# Altium footprint library lib_eps.PcbLib: 113 footprints (part 4 of 8)
Each footprint in its own frame and in the unit in brackets; x right, y up, seen from the top. Pads: shape width x height; smd on the part's side, far side on the other; paste and mask are expansions set on the pad; w line width, h text height; cw(c..) or ccw(c..) is an arc to the next point about the centre after c.
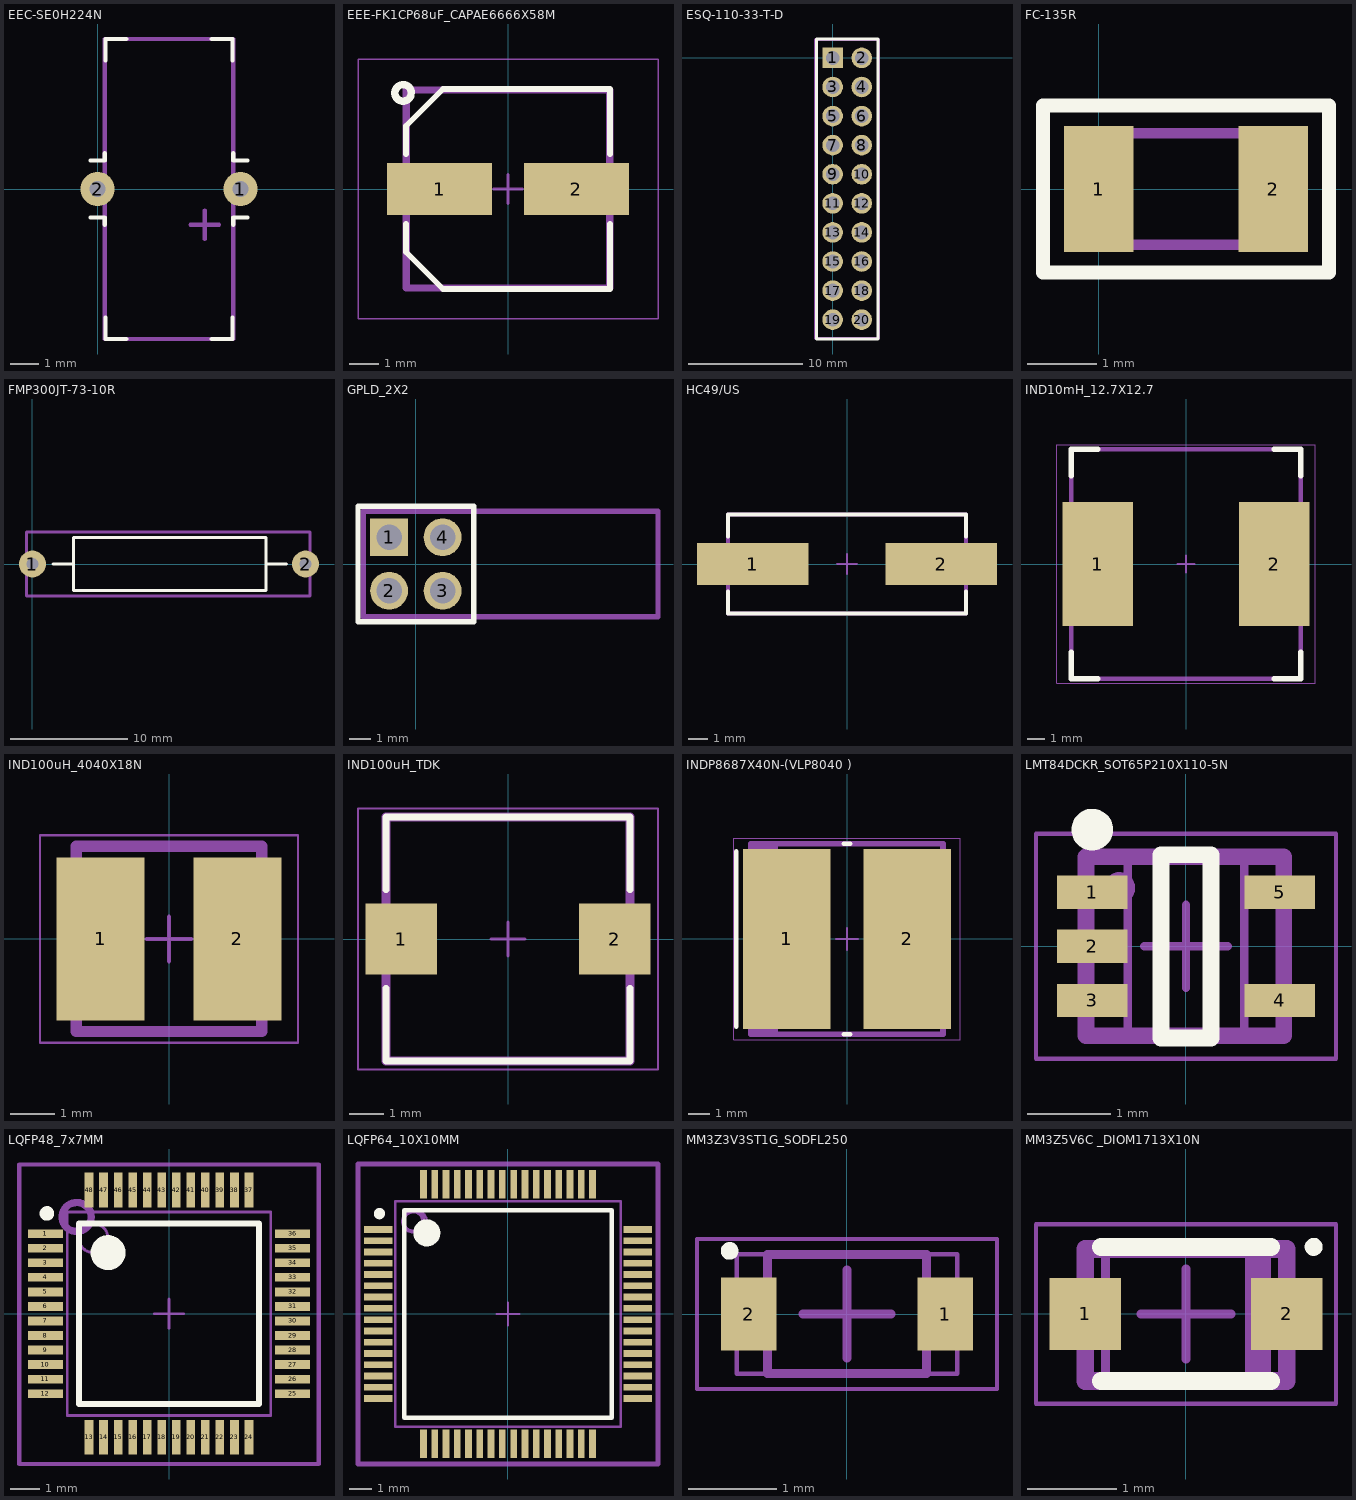
[diagram p3: the footprints below, top view; thin cyan lines are the x and y axes]

## EEC-SE0H224N [mm] "CAP .22F 5.5V T/H"
pads (2):
  round 1.2 hole 0.55: 1(5,0) 2(0,0)
Top Overlay:
  lines w0.15: -0.25,-1 0.25,-1 0.25,-1.25 ; -0.25,1 0.25,1 0.25,1.25 ; 0.275,-4.5 0.275,-5.25 1,-5.25 ; 0.275,4.5 0.275,5.25 1,5.25 ; 4,-5.25 4.725,-5.25 4.725,-4.5 ; 4,5.25 4.725,5.25 4.725,4.5 ; 4.75,-1.25 4.75,-1 5.25,-1 ; 4.75,1.25 4.75,1 5.25,1
Mechanical 29:
  lines w0.15: 3.75,-1.75 3.75,-0.75 3.75,-1.25 ; 3.75,-1.25 4.25,-1.25 3.25,-1.25 3.75,-1.25 ; 0,-0.25 0,0.25 0.25,0.25 0.25,5.25 4.75,5.25 4.75,0.25 5,0.25 5,-0.25 4.75,-0.25 4.75,-5.25 0.25,-5.25 0.25,-0.25 0,-0.25
  text "'.Designator'" at 2.5,-5.25 h1

## EEE-FK1CP68uF_CAPAE6666X58M [mm] "Aluminum Electrolytic Capacitor, Body 7,00x6,60x5,80mm, IPC Low Density"
height 5.8
pads (2):
  rect 3.6x1.8 smd: 1(-2.35,0) 2(2.35,0)
Top Overlay:
  lines w0.2: -3.5,-1.2 -3.5,-2.165 -2.235,-3.43 3.5,-3.43 3.5,-1.2 ; -3.5,1.2 -3.5,2.165 -2.235,3.43 3.5,3.43 3.5,1.2
  lines w0.254: -3.332,3.211 cw(c-3.6,3.3) -3.317,3.3
Mechanical 13:
  lines w0.1: -3.5,-2.165 -3.5,2.165 -2.235,3.43 3.5,3.43 3.5,-3.43 -2.235,-3.43 -3.5,-2.165
Mechanical 15:
  lines w0.05: -5.15,-4.45 5.15,-4.45 5.15,4.45 -5.15,4.45 -5.15,-4.45
  lines w0.1: -0.5,0 0.5,0 ; 0,-0.5 0,0.5
Mechanical 29:
  lines w0.254: -3.5,-3.4 -3.5,-1 -3.5,3.4 3.5,3.4 3.5,-3.4 -3.5,-3.4
  text "'.Designator'" at -4.1,-0.9 h1.52
3D body "CPEEE-FK1CP68uF_CAPAE6666X58M.step": height 5.8, standoff -0.4, extent -3.5,-3.43 3.5,3.43

## ESQ-110-33-T-D [mm] "CONN SOCKET 20POS 0.1 TIN PCB"
height 0.231
pads (20):
  rect 1.8x1.8 hole 1.2: 1(0,0)
  round 1.8 hole 1.2: 2(2.54,0) 3(0,-2.54) 4(2.54,-2.54) 5(0,-5.08) 6(2.54,-5.08) 7(0,-7.62) 8(2.54,-7.62) 9(0,-10.16) 10(2.54,-10.16) 11(0,-12.7) 12(2.54,-12.7) 13(0,-15.24) 14(2.54,-15.24) 15(0,-17.78) 16(2.54,-17.78) 17(0,-20.32) 18(2.54,-20.32) 19(0,-22.86) 20(2.54,-22.86)
Top Overlay:
  lines w0.254: -1.425,-24.55 -1.425,1.65 3.95,1.65 3.95,-24.55 -1.425,-24.55
Mechanical 29:
  lines w0.254: -1.5,-24.5 -1.25,-24.5 4,-24.5 4,1.6 -1.5,1.6 -1.5,-24.5
  text "'.Designator'" at 2.1,-19.8 h1.52
3D body "ESQ-110-33-T-D.stp": height 16.41, standoff -2.01, extent -1.29,-24.408 3.79,1.5

## FC-135R [mm] "FC-135 32.7680KA-A5.FC-135 32.7680KA-A5"
pads (2):
  rect 1x1.8 smd: 1(0,0) 2(2.5,0)
Top Overlay:
  lines w0.2: -0.8,-1.2 3.3,-1.2 3.3,1.2 -0.8,1.2 -0.8,-1.2
Mechanical 29:
  lines w0.15: -0.3,-0.8 -0.3,0.8 2.8,0.8 2.8,-0.8 -0.3,-0.8
  text "'.Designator'" at 0.3,-0.5 h1
3D body "EPSON_SG-3030CM.STEP": height 0.9, standoff 0, extent -0.351,-0.751 2.851,0.751

## FMP300JT-73-10R [mm] "RES 10 OHM 3W 5% AXIAL"
pads (2):
  round 2.3 hole 1: 1(0,0) 2(23.375,0)
Top Overlay:
  lines w0.254: 1.75,0 3.5,0 ; 21.75,0 20,0 ; 3.5,0 3.5,2.25 20,2.25 20,0 ; 3.5,0 3.5,-2.25 20,-2.25 20,0
Mechanical 29:
  lines w0.254: -0.5,-2.75 -0.5,1.25 -0.5,2.75 23.75,2.75 23.75,-2.75 -0.5,-2.75
  text "'.Designator'" at 6.5,-0.75 h1.52
3D body "YAG_FMP300.step": height 5.51, standoff -0.67, extent -0.432,-2.756 23.8,2.756

## GPLD_2X2 [mm] "CONN SOCKET 20POS 0.1 TIN PCB"
height 0.231
pads (4):
  rect 1.8x1.8 hole 1.2: 1(-1.27,1.27)
  round 1.8 hole 1.2: 2(-1.27,-1.27) 3(1.27,-1.27) 4(1.27,1.27)
Top Overlay:
  lines w0.254: -2.75,-2.75 -2.75,2.5 -2.75,2.75 2.75,2.75 2.75,-2.75 -2.75,-2.75
Mechanical 29:
  lines w0.254: -2.5,-2.5 -2.5,2.5 2.5,2.5 11.5,2.5 11.5,-2.5 2.5,-2.5 -2.5,-2.5
  text "'.Designator'" at -2,-0.1 h0.6
3D body "DS1022-2x2RF11.stp": height 5, standoff -3, extent -1.59,-2.54 11.45,2.54

## HC49/US [mm] "HC/49US (AT49) SMD LOW PROFILE CRYSTAL"
pads (2):
  rect 5.6x2.1 smd: 1(-4.75,0) 2(4.75,0)
Top Overlay:
  lines w0.2: -6,-1.372 -6,-2.5 6,-2.5 6,-1.372 ; -6,1.372 -6,2.5 6,2.5 6,1.372
Mechanical 15:
  lines w0.1: -0.5,0 0.5,0 ; 0,-0.5 0,0.5
Mechanical 29:
  lines w0.2: -6,0.457 -6.68,0.457 -6.68,-0.559 -5.994,-0.559 ; 5.994,0.483 6.68,0.483 6.68,-0.533 6,-0.533 ; -6,-2.5 6,-2.5 6,2.5 -6,2.5 -6,-2.5
  text ".Designator" at -3.632,-0.305 h0.8
3D body "ABLS.STEP": height 4.21, standoff 0.05, extent -6.35,-2.388 6.35,2.311

## IND10mH_12.7X12.7 [mm] "Precision Wire Wound Inductor, 2-Leads, Body 12,70x12,70mm, IPC Medium Density"
height 8.5
pads (2):
  rect 4x7 smd: 1(-5,0) 2(5,0)
Top Overlay:
  lines w0.3: -6.5,-5 -6.5,-6.5 -5,-6.5 ; -6.5,5 -6.5,6.5 -5,6.5 ; 5,-6.5 6.5,-6.5 6.5,-5 ; 5,6.5 6.5,6.5 6.5,5
Mechanical 13:
  lines w0.1: -6.5,-6.5 6.5,-6.5 6.5,6.5 -6.5,6.5 -6.5,-6.5
Mechanical 15:
  lines w0.05: -7.325,-6.75 7.325,-6.75 7.325,6.75 -7.325,6.75 -7.325,-6.75
  lines w0.1: -0.5,0 0.5,0 ; 0,-0.5 0,0.5
Mechanical 29:
  lines w0.254: -6.5,-6.5 6.5,-6.5 6.5,6.5 -6.5,6.5 -6.5,3.75 -6.5,-6.5
  text "'.Designator'" at -4.2,-1 h1.52
3D body "IND10mH_12.7X12.7.step": height 8.6, standoff 0, extent -6.45,-6.35 6.45,6.35

## IND100uH_4040X18N [mm] "Precision Wire Wound Inductor, 2-Leads, Body 4,00x4,00mm, IPC Medium Density"
height 1.8
pads (2):
  rect 2x3.7 smd: 1(-1.55,0) 2(1.55,0)
Mechanical 13:
  lines w0.1: -2.1,-2.1 -2.1,2.1 2.1,2.1 2.1,-2.1 -2.1,-2.1
Mechanical 15:
  lines w0.05: -2.925,-2.35 -2.925,2.35 2.925,2.35 2.925,-2.35 -2.925,-2.35
  lines w0.1: -0.5,0 0.5,0 ; 0,-0.5 0,0.5
Mechanical 29:
  lines w0.254: -2.1,-2.1 2.1,-2.1 2.1,2.1 -2.1,2.1 -2.1,-2.1
  text "'.Designator'" at -1.6,-0.5 h1
3D body "IND100uH_4040X18N.step": height 1.9, standoff 0, extent -2.1,-2 2.1,2

## IND100uH_TDK [mm] "Precision Wire Wound Inductor, 2-Leads, Body 7,00x7,00mm, IPC Medium Density"
height 4.5
pads (2):
  rect 2.1x2.1 smd: 1(-3.15,0) 2(3.15,0)
Top Overlay:
  lines w0.2: -3.6,-1.45 -3.6,-3.6 3.6,-3.6 3.6,-1.45 ; -3.6,1.45 -3.6,3.6 3.6,3.6 3.6,1.45
Mechanical 13:
  lines w0.1: -3.6,-3.6 3.6,-3.6 3.6,3.6 -3.6,3.6 -3.6,-3.6
Mechanical 15:
  lines w0.05: -4.425,-3.85 4.425,-3.85 4.425,3.85 -4.425,3.85 -4.425,-3.85
  lines w0.1: -0.5,0 0.5,0 ; 0,-0.5 0,0.5
Mechanical 29:
  lines w0.254: -3.6,-3.6 -3.6,1.2 -3.6,3.6 3.6,3.6 3.6,-3.6 -3.6,-3.6
  text "'.Designator'" at -3.9,-0.5 h1.52
3D body "IND100uH_TDK.step": height 4.6, standoff 0, extent -3.6,-3.5 3.6,3.5

## INDP8687X40N-(VLP8040 ) [mm] "Precision Wire Wound Inductor, 2-Leads, Body 8,60x8,70mm, IPC Medium Density"
height 4
pads (2):
  rect 4x8.2 smd paste-5: 1(-2.75,0) 2(2.75,0)
Top Overlay:
  lines w0.2: -5.05,-4 -5.05,4 ; -0.15,-4.35 0.15,-4.35 ; -0.15,4.35 0.15,4.35
Top Paste:
  region: 3.15,-2.5 4.65,-2.5 4.65,-3.8 3.15,-3.8
  region: 0.85,-2.5 2.35,-2.5 2.35,-3.8 0.85,-3.8
  region: 3.15,-0.4 4.65,-0.4 4.65,-1.7 3.15,-1.7
  region: 0.85,-0.4 2.35,-0.4 2.35,-1.7 0.85,-1.7
  region: 3.15,1.7 4.65,1.7 4.65,0.4 3.15,0.4
  region: 0.85,1.7 2.35,1.7 2.35,0.4 0.85,0.4
  region: 3.15,3.8 4.65,3.8 4.65,2.5 3.15,2.5
  region: 0.85,3.8 2.35,3.8 2.35,2.5 0.85,2.5
  region: -2.35,-2.5 -0.85,-2.5 -0.85,-3.8 -2.35,-3.8
  region: -4.65,-2.5 -3.15,-2.5 -3.15,-3.8 -4.65,-3.8
  region: -2.35,-0.4 -0.85,-0.4 -0.85,-1.7 -2.35,-1.7
  region: -4.65,-0.4 -3.15,-0.4 -3.15,-1.7 -4.65,-1.7
  region: -2.35,1.7 -0.85,1.7 -0.85,0.4 -2.35,0.4
  region: -4.65,1.7 -3.15,1.7 -3.15,0.4 -4.65,0.4
  region: -2.35,3.8 -0.85,3.8 -0.85,2.5 -2.35,2.5
  region: -4.65,3.8 -3.15,3.8 -3.15,2.5 -4.65,2.5
Mechanical 13:
  rectangle: -4.3,-4.35 -3.143,4.35
  lines w0.1: -4.3,-4.35 -4.3,4.35 4.3,4.35 4.3,-4.35 -4.3,-4.35
Mechanical 15:
  lines w0.05: -5.175,-4.6 -5.175,4.6 5.175,4.6 5.175,-4.6 -5.175,-4.6
  lines w0.1: -0.5,0 0.5,0 ; 0,-0.5 0,0.5
Mechanical 29:
  lines w0.254: -4.4,-4.35 4.4,-4.35 4.4,4.35 -4.4,4.35 -4.4,-4.35
  text "'.Designator'" at -2.6,-0.5 h2
3D body "INDP8687X40N-(VLP8040 ).step": height 4.1, standoff 0, extent -4.4,-4.35 4.4,4.35

## LMT84DCKR_SOT65P210X110-5N [mm] "SOT23, 5-Leads, Body 2,00x2,10mm, Pitch 0,65mm, IPC Medium Density"
height 1.1
pads (5):
  rect 0.85x0.4 smd mask+0.051: 1(-1.125,0.65) 2(-1.125,0) 3(-1.125,-0.65) 4(1.125,-0.65) 5(1.125,0.65)
Top Overlay:
  circle w0.25: c-1.125,1.4 r0.125
  lines w0.2: -0.3,-1.1 0.3,-1.1 0.3,1.1 -0.3,1.1 -0.3,-1.1
Mechanical 13:
  lines w0.1: -0.7,-1.075 -0.7,1.075 0.7,1.075 0.7,-1.075 -0.7,-1.075
Mechanical 15:
  lines w0.05: -1.8,-1.35 -1.8,1.35 1.8,1.35 1.8,-1.35 -1.8,-1.35
  lines w0.1: -0.5,0 0.5,0 ; 0,-0.5 0,0.5
Mechanical 29:
  circle w0.18: c-0.8,0.7 r0.1
  lines w0.2: -1.2,-1.075 1.175,-1.075 1.175,1.075 -1.2,1.075 -1.2,0.537 -1.2,-0.537 -1.2,-1.075
  text "'.Designator'" at -0.9,-0.2 h0.6
3D body "LMT84DCKR_SOT65P210X110-5N.step": height 1.1, standoff 0, extent -1.2,-1.075 1.2,1.075

## LQFP48_7x7MM [mm] "LQFP, 48-Leads, Body 7,00x7,00mm, Pitch 0,50mm"
height 1.6
pads (48):
  rect 1.2x0.3 smd mask+0.051: 1(-4.25,2.75) 2(-4.25,2.25) 3(-4.25,1.75) 4(-4.25,1.25) 5(-4.25,0.75) 6(-4.25,0.25) 7(-4.25,-0.25) 8(-4.25,-0.75) 9(-4.25,-1.25) 10(-4.25,-1.75) 11(-4.25,-2.25) 12(-4.25,-2.75) 25(4.25,-2.75) 26(4.25,-2.25) 27(4.25,-1.75) 28(4.25,-1.25) 29(4.25,-0.75) 30(4.25,-0.25) 31(4.25,0.25) 32(4.25,0.75) 33(4.25,1.25) 34(4.25,1.75) 35(4.25,2.25) 36(4.25,2.75)
  rect 0.3x1.2 smd mask+0.051: 13(-2.75,-4.25) 14(-2.25,-4.25) 15(-1.75,-4.25) 16(-1.25,-4.25) 17(-0.75,-4.25) 18(-0.25,-4.25) 19(0.25,-4.25) 20(0.75,-4.25) 21(1.25,-4.25) 22(1.75,-4.25) 23(2.25,-4.25) 24(2.75,-4.25) 37(2.75,4.25) 38(2.25,4.25) 39(1.75,4.25) 40(1.25,4.25) 41(0.75,4.25) 42(0.25,4.25) 43(-0.25,4.25) 44(-0.75,4.25) 45(-1.25,4.25) 46(-1.75,4.25) 47(-2.25,4.25) 48(-2.75,4.25)
Top Overlay:
  circle w0.6: c-2.1,2.1 r0.3
  circle w0.25: c-4.2,3.45 r0.125
  lines w0.2: -3.1,-3.1 3.1,-3.1 3.1,3.1 -3.1,3.1 -3.1,-3.1
Mechanical 13:
  circle w0.1: c-2.6,2.6 r0.5
  lines w0.1: -3.5,-3.5 3.5,-3.5 3.5,3.5 -3.5,3.5 -3.5,-3.5
Mechanical 15:
  lines w0.05: -5.15,-5.15 5.15,-5.15 5.15,5.15 -5.15,5.15 -5.15,-5.15
  lines w0.1: -0.5,0 0.5,0 ; 0,-0.5 0,0.5
Mechanical 29:
  circle w0.254: c-3.175,3.327 r0.5
  lines w0.15: -5.15,-5.169 -5.15,5.131 5.15,5.131 5.15,-5.169 -5.15,-5.169
  text ".Designator" at -2.184,-0.483 h1.2
3D body "LQFP48_7x7MM.step": height 1.6, standoff 0, extent -4.5,-4.5 4.5,4.5

## LQFP64_10X10MM [mm] "LQFP, 64-Leads, Body 10,00x10,00mm, Pitch 0,50mm, IPC Medium Density"
height 1.6
pads (64):
  rect 1.25x0.3 smd: 1(-5.75,3.75) 2(-5.75,3.25) 3(-5.75,2.75) 4(-5.75,2.25) 5(-5.75,1.75) 6(-5.75,1.25) 7(-5.75,0.75) 8(-5.75,0.25) 9(-5.75,-0.25) 10(-5.75,-0.75) 11(-5.75,-1.25) 12(-5.75,-1.75) 13(-5.75,-2.25) 14(-5.75,-2.75) 15(-5.75,-3.25) 16(-5.75,-3.75) 33(5.75,-3.75) 34(5.75,-3.25) 35(5.75,-2.75) 36(5.75,-2.25) 37(5.75,-1.75) 38(5.75,-1.25) 39(5.75,-0.75) 40(5.75,-0.25) 41(5.75,0.25) 42(5.75,0.75) 43(5.75,1.25) 44(5.75,1.75) 45(5.75,2.25) 46(5.75,2.75) 47(5.75,3.25) 48(5.75,3.75)
  rect 0.3x1.25 smd: 17(-3.75,-5.75) 18(-3.25,-5.75) 19(-2.75,-5.75) 20(-2.25,-5.75) 21(-1.75,-5.75) 22(-1.25,-5.75) 23(-0.75,-5.75) 24(-0.25,-5.75) 25(0.25,-5.75) 26(0.75,-5.75) 27(1.25,-5.75) 28(1.75,-5.75) 29(2.25,-5.75) 30(2.75,-5.75) 31(3.25,-5.75) 32(3.75,-5.75) 49(3.75,5.75) 50(3.25,5.75) 51(2.75,5.75) 52(2.25,5.75) 53(1.75,5.75) 54(1.25,5.75) 55(0.75,5.75) 56(0.25,5.75) 57(-0.25,5.75) 58(-0.75,5.75) 59(-1.25,5.75) 60(-1.75,5.75) 61(-2.25,5.75) 62(-2.75,5.75) 63(-3.25,5.75) 64(-3.75,5.75)
Top Overlay:
  circle w0.6: c-3.6,3.6 r0.3
  circle w0.25: c-5.7,4.45 r0.125
  lines w0.2: -4.6,-4.6 4.6,-4.6 4.6,4.6 -4.6,4.6 -4.6,-4.6
Mechanical 13:
  circle w0.1: c-4.1,4.1 r0.5
  lines w0.1: -5,-5 5,-5 5,5 -5,5 -5,-5
Mechanical 15:
  lines w0.05: -6.65,-6.65 -6.65,6.65 6.65,6.65 6.65,-6.65 -6.65,-6.65
  lines w0.1: -0.5,0 0.5,0 ; 0,-0.5 0,0.5
Mechanical 29:
  circle w0.18: c-4.2,4.1 r0.447
  lines w0.2: -6.65,-6.65 6.65,-6.65 6.65,6.65 -6.65,6.65 -6.65,-6.65
  text ".Designator" at -2.997,-0.406 h1.2
3D body "QFP127P600-8N.step": height 1.6, standoff 0, extent -6,-6 6,6

## MM3Z3V3ST1G_SODFL250 [mm] "SODFL, 2-Leads, Body 1,25x2,50mm, IPC Medium Density"
height 1.1
pads (2):
  rect 0.63x0.83 smd: 1(1.115,0) 2(-1.115,0)
Top Overlay:
  circle w0.1: c-1.33,0.715 r0.05
Mechanical 13:
  lines w0.1: -0.9,-0.675 -0.9,0.675 0.9,0.675 0.9,-0.675 -0.9,-0.675
Mechanical 15:
  lines w0.05: -1.7,-0.85 -1.7,0.85 1.7,0.85 1.7,-0.85 -1.7,-0.85
  lines w0.1: -0.5,0 0.5,0 ; 0,-0.5 0,0.5
Mechanical 29:
  lines w0.05: -1.25,-0.675 -1.25,0.675 1.25,0.675 1.25,-0.675 -1.25,-0.675
  text "'.Designator'" at -0.75,-0.275 h0.6
3D body "MM3Z3V3ST1G_SODFL250.step": height 1.1, standoff 0, extent -1.25,-0.675 1.25,0.675

## MM3Z5V6C _DIOM1713X10N [mm] "Molded Diode, 2-Leads, Body 1,70x1,30mm, IPC Medium Density"
height 1
pads (2):
  rect 0.8x0.8 smd: 1(-1.125,0) 2(1.125,0)
Top Overlay:
  circle w0.1: c1.425,0.75 r0.05
  lines w0.2: -0.95,-0.75 0.95,-0.75 ; -0.95,0.75 0.95,0.75
Mechanical 13:
  rectangle: 0.658,-0.725 0.9,0.725
  lines w0.1: -0.9,-0.725 -0.9,0.725 0.9,0.725 0.9,-0.725 -0.9,-0.725
Mechanical 15:
  lines w0.05: -1.675,-1 -1.675,1 1.675,1 1.675,-1 -1.675,-1
  lines w0.1: -0.5,0 0.5,0 ; 0,-0.5 0,0.5
Mechanical 29:
  lines w0.2: -1.125,-0.75 -1.125,0.725 1.125,0.725 1.125,-0.75 -1.125,-0.75
  text "'.Designator'" at -0.9,-0.3 h0.6
3D body "MM3Z5V6C _DIOM1713X10N.step": height 1, standoff 0, extent -1.12,-0.725 1.12,0.725